# Altium footprint library goldpin_male_pcb.PcbLib: 157 footprints (part 5 of 10)
Each footprint in its own frame and in the unit in brackets; x right, y up, seen from the top. Pads: shape width x height; smd on the part's side, far side on the other; paste and mask are expansions set on the pad; w line width, h text height; cw(c..) or ccw(c..) is an arc to the next point about the centre after c.
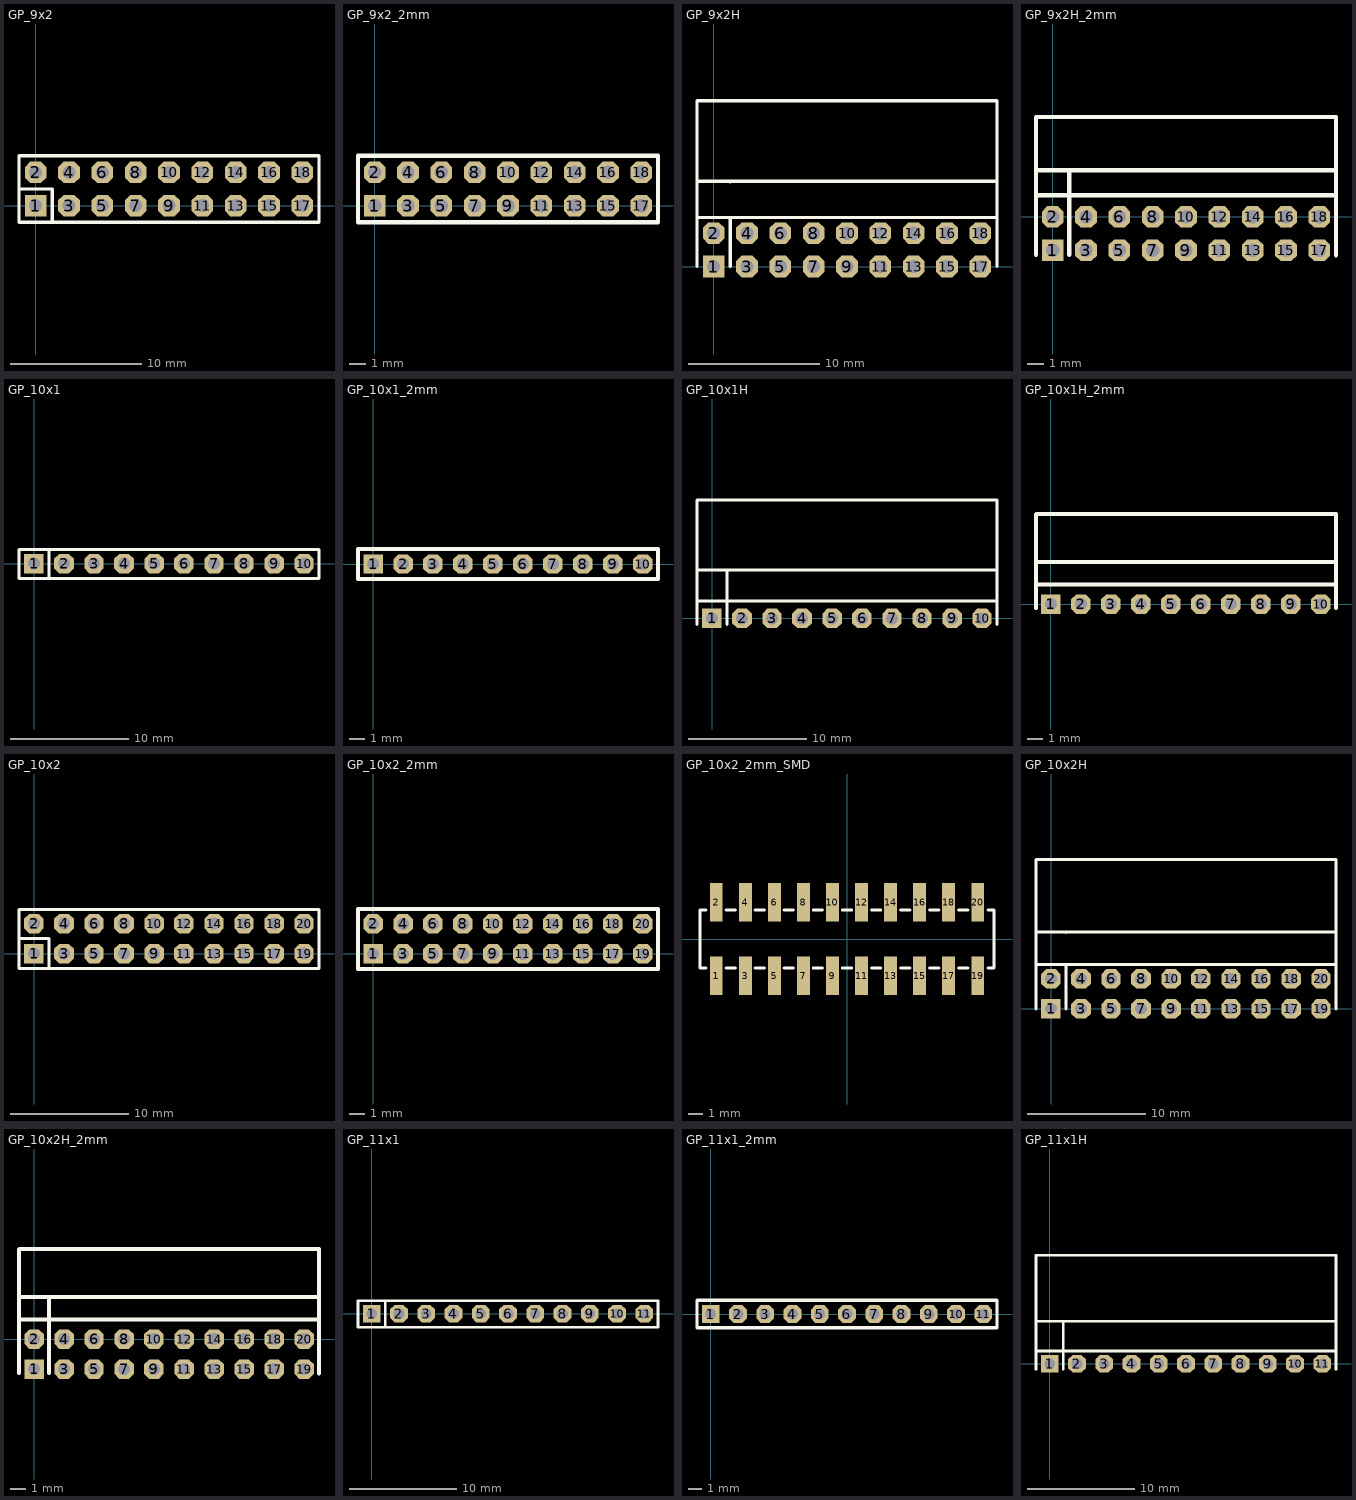
[diagram p4: the footprints below, top view; thin cyan lines are the x and y axes]

## GP_9x2 [mil]
pads (18):
  rect 65x65 hole 39.37: 1(0,0)
  oct 65x65 hole 39.37: 2(0,100) 3(100,0) 4(100,100) 5(200,0) 6(200,100) 7(300,0) 8(300,100) 9(400,0) 10(400,100) 11(500,0) 12(500,100) 13(600,0) 14(600,100) 15(700,0) 16(700,100) 17(800,0) 18(800,100)
Top Overlay:
  lines w10: -50,50 50,50 50,-50 ; -50,-50 850,-50 850,150 -50,150 -50,-50
3D body "Samtec-TSW-109-23-F-D.STEP": height 330, standoff -115, extent -50,-50 850,150

## GP_9x2_2mm [mm]
height 4.45
pads (18):
  rect 1.3x1.3 hole 0.8: 1(0,0)
  oct 1.3x1.3 hole 0.8: 2(0,2) 3(2,0) 4(2,2) 5(4,0) 6(4,2) 7(6,0) 8(6,2) 9(8,0) 10(8,2) 11(10,0) 12(10,2) 13(12,0) 14(12,2) 15(14,0) 16(14,2) 17(16,0) 18(16,2)
Top Overlay:
  lines w0.254: -1,-1 -1,2.999 17,2.999 17,-1 -1,-1
3D body "Samtec-TMM-109-03-G-D.STEP": height 6.51, standoff -1.69, extent -1,-0.968 17,2.969

## GP_9x2H [mil]
pads (18):
  rect 65x65 hole 39.37: 1(0,0)
  oct 65x65 hole 39.37: 2(0,100) 3(100,0) 4(100,100) 5(200,0) 6(200,100) 7(300,0) 8(300,100) 9(400,0) 10(400,100) 11(500,0) 12(500,100) 13(600,0) 14(600,100) 15(700,0) 16(700,100) 17(800,0) 18(800,100)
Top Overlay:
  lines w10: -50,0 -50,180.31 -50,497.64 850,497.64 850,0 ; -50,147.24 850,147.24 ; -50,255.51 850,255.51 ; 49.21,255.51 50,254.72 ; 50,0 50,147.24
3D body "Samtec-TSW-109-08-F-D-RA.STEP": height 220, standoff -90, extent -50,-12.5 850,490

## GP_9x2H_2mm [mm]
height 4.45
pads (18):
  rect 1.3x1.3 hole 0.8: 1(0,-2)
  oct 1.3x1.3 hole 0.8: 2(0,0) 3(2,-2) 4(2,0) 5(4,-2) 6(4,0) 7(6,-2) 8(6,0) 9(8,-2) 10(8,0) 11(10,-2) 12(10,0) 13(12,-2) 14(12,0) 15(14,-2) 16(14,0) 17(16,-2) 18(16,0)
Top Overlay:
  lines w0.254: -1,-2.275 -1,1.822 -1,5.973 ; -1,1.3 17,1.3 ; -1,2.8 17,2.8 ; 0.99,-2.275 0.99,2.775 ; 17,-2.3 17,6
  lines w0.256: -1,5.973 -0.973,6 17,6
3D body "Samtec-TMM-109-03-G-D-RA.STEP": height 3.97, standoff -3.02, extent -1.025,-2.261 16.975,5.961

## GP_10x1 [mil]
pads (10):
  rect 65x65 hole 39.37: 1(0,0)
  oct 65x65 hole 39.37: 2(100,0) 3(200,0) 4(300,0) 5(400,0) 6(500,0) 7(600,0) 8(700,0) 9(800,0) 10(900,0)
Top Overlay:
  lines w10: 50,-50 50,47.24 ; -50,-50 -50,47.24 950,47.24 950,-50 -50,-50
3D body "Samtec-TSW-110-23-F-S.STEP": height 330, standoff -115, extent -50,-50 950,50

## GP_10x1_2mm [mm]
height 4.45
pads (10):
  rect 1.3x1.3 hole 0.8: 1(0,0)
  oct 1.3x1.3 hole 0.8: 2(2,0) 3(4,0) 4(6,0) 5(8,0) 6(10,0) 7(12,0) 8(14,0) 9(16,0) 10(18,0)
Top Overlay:
  lines w0.254: -1,-1 19,-1 19,1 -1,1 -1,-1
3D body "Samtec-TMM-110-03-G-S.STEP": height 5.51, standoff -2.69, extent -1,-0.99 19,0.991

## GP_10x1H [mil]
pads (10):
  rect 65x65 hole 39.37: 1(0,0)
  oct 65x65 hole 39.37: 2(100,0) 3(200,0) 4(300,0) 5(400,0) 6(500,0) 7(600,0) 8(700,0) 9(800,0) 10(900,0)
Top Overlay:
  lines w10: -50,-19.68 -50,80.31 -50,395 950,395 950,-19.68 ; -50,57.24 950,57.24 ; -50,160.51 950,160.51 ; 50,-19.68 50,80.31 50,160.51
3D body "Samtec-TSW-110-08-F-S-RA.STEP": height 120, standoff -90, extent -50,-10 950,392.5

## GP_10x1H_2mm [mm]
height 4.45
pads (10):
  rect 1.3x1.3 hole 0.8: 1(0,0)
  oct 1.3x1.3 hole 0.8: 2(2,0) 3(4,0) 4(6,0) 5(8,0) 6(10,0) 7(12,0) 8(14,0) 9(16,0) 10(18,0)
Top Overlay:
  lines w0.254: -1,-0.25 -1,1.822 -1,5.973 ; -1,1.3 19,1.3 ; -1,2.8 19,2.8
  lines w0.256: -1,5.973 -0.973,6 19,6 19,-0.25
3D body "Samtec-TMM-110-03-G-S-RA.STEP": height 1.99, standoff -3.04, extent -1,-0.25 19,5.973

## GP_10x2 [mil]
pads (20):
  rect 65x65 hole 39.37: 1(0,0)
  oct 65x65 hole 39.37: 2(0,100) 3(100,0) 4(100,100) 5(200,0) 6(200,100) 7(300,0) 8(300,100) 9(400,0) 10(400,100) 11(500,0) 12(500,100) 13(600,0) 14(600,100) 15(700,0) 16(700,100) 17(800,0) 18(800,100) 19(900,0) 20(900,100)
Top Overlay:
  lines w10: -50,50 50,50 50,-50 ; -50,-50 950,-50 950,147.24 -50,147.24 -50,-50
3D body "Samtec-TSW-110-23-F-D.STEP": height 330, standoff -115, extent -50,-50 950,150

## GP_10x2_2mm [mm]
height 4.45
pads (20):
  rect 1.3x1.3 hole 0.8: 1(0,0)
  oct 1.3x1.3 hole 0.8: 2(0,2) 3(2,0) 4(2,2) 5(4,0) 6(4,2) 7(6,0) 8(6,2) 9(8,0) 10(8,2) 11(10,0) 12(10,2) 13(12,0) 14(12,2) 15(14,0) 16(14,2) 17(16,0) 18(16,2) 19(18,0) 20(18,2)
Top Overlay:
  lines w0.254: -1,-1 -1,2.999 19,2.999 19,-1 -1,-1
3D body "Samtec-TMM-110-03-G-D.STEP": height 5.51, standoff -2.69, extent -1,-0.968 19,2.969

## GP_10x2_2mm_SMD [mm]
pads (20):
  rect 0.89x2.65 smd: 1(-9,-2.54) 2(-9,2.54) 3(-7,-2.54) 4(-7,2.54) 5(-5,-2.54) 6(-5,2.54) 7(-3,-2.54) 8(-3,2.54) 9(-1,-2.54) 10(-1,2.54) 11(1,-2.54) 12(1,2.54) 13(3,-2.54) 14(3,2.54) 15(5,-2.54) 16(5,2.54) 17(7,-2.54) 18(7,2.54) 19(9,-2.54) 20(9,2.54)
Top Overlay:
  lines w0.2: -9.7,-2 -10.125,-2 -10.125,2 -9.7,2 ; -8.325,-2 -7.675,-2 ; -8.325,2 -7.675,2 ; -6.325,-2 -5.675,-2 ; -6.325,2 -5.675,2 ; -4.325,-2 -3.675,-2 ; -4.325,2 -3.675,2 ; -2.325,-2 -1.675,-2 ; -2.325,2 -1.675,2 ; -0.325,-2 0.325,-2 ; -0.325,2 0.325,2 ; 1.675,-2 2.325,-2 ; 1.675,2 2.325,2 ; 3.675,-2 4.325,-2 ; 3.675,2 4.325,2 ; 5.675,-2 6.325,-2 ; 5.675,2 6.325,2 ; 7.675,-2 8.325,-2 ; 7.675,2 8.325,2 ; 9.7,-2 10.125,-2 10.125,2 9.7,2
3D body "Samtec-TMM-110-01-G-D-SM.STEP": height 5.9, standoff -0.07, extent -10,-3.27 10,3.334

## GP_10x2H [mil]
pads (20):
  rect 65x65 hole 39.37: 1(0,0)
  oct 65x65 hole 39.37: 2(0,100) 3(100,0) 4(100,100) 5(200,0) 6(200,100) 7(300,0) 8(300,100) 9(400,0) 10(400,100) 11(500,0) 12(500,100) 13(600,0) 14(600,100) 15(700,0) 16(700,100) 17(800,0) 18(800,100) 19(900,0) 20(900,100)
Top Overlay:
  lines w10: -50,0 -50,180.31 -50,497.64 950,497.64 950,0 ; -50,147.24 950,147.24 ; -50,255.51 950,255.51 ; 49.21,255.51 50,254.72 ; 50,0 50,147.24
3D body "Samtec-TSW-110-08-F-D-RA.STEP": height 220, standoff -90, extent -50,-10 950,492.5

## GP_10x2H_2mm [mm]
height 4.45
pads (20):
  rect 1.3x1.3 hole 0.8: 1(0,-2)
  oct 1.3x1.3 hole 0.8: 2(0,0) 3(2,-2) 4(2,0) 5(4,-2) 6(4,0) 7(6,-2) 8(6,0) 9(8,-2) 10(8,0) 11(10,-2) 12(10,0) 13(12,-2) 14(12,0) 15(14,-2) 16(14,0) 17(16,-2) 18(16,0) 19(18,-2) 20(18,0)
Top Overlay:
  lines w0.254: -1,-2.275 -1,1.822 -1,5.973 ; -1,1.3 19,1.3 ; -1,2.8 19,2.8 ; 0.99,-2.275 0.99,2.775 ; 19,-2.3 19,6
  lines w0.256: -1,5.973 -0.973,6 19,6
3D body "Samtec-TMM-110-03-G-D-RA.STEP": height 3.97, standoff -3.02, extent -1.025,-2.261 18.975,5.961

## GP_11x1 [mil]
pads (11):
  rect 65x65 hole 39.37: 1(0,0)
  oct 65x65 hole 39.37: 2(100,0) 3(200,0) 4(300,0) 5(400,0) 6(500,0) 7(600,0) 8(700,0) 9(800,0) 10(900,0) 11(1000,0)
Top Overlay:
  lines w10: 50,-50 50,47.24 ; -50,-50 -50,47.24 1050,47.24 1050,-50 -50,-50
3D body "Samtec-TSW-111-23-F-S.STEP": height 330, standoff -115, extent -50,-50 1050,50

## GP_11x1_2mm [mm]
height 4.45
pads (11):
  rect 1.3x1.3 hole 0.8: 1(0,0)
  oct 1.3x1.3 hole 0.8: 2(2,0) 3(4,0) 4(6,0) 5(8,0) 6(10,0) 7(12,0) 8(14,0) 9(16,0) 10(18,0) 11(20,0)
Top Overlay:
  lines w0.254: -1,-1 21,-1 21,1 -1,1 -1,-1
3D body "Samtec-TMM-111-03-G-S.STEP": height 5.51, standoff -2.69, extent -1,-0.99 21,0.991

## GP_11x1H [mil]
pads (11):
  rect 65x65 hole 39.37: 1(0,0)
  oct 65x65 hole 39.37: 2(100,0) 3(200,0) 4(300,0) 5(400,0) 6(500,0) 7(600,0) 8(700,0) 9(800,0) 10(900,0) 11(1000,0)
Top Overlay:
  lines w10: -50,-19.68 -50,80.31 -50,397.64 1050,397.64 1050,-19.68 ; -50,47.24 1050,47.24 ; -50,155.51 1050,155.51 ; 49.21,155.51 50,154.72 50,80.31 50,-19.68
3D body "Samtec-TSW-111-08-F-S-RA.STEP": height 120, standoff -90, extent -50,-10 1050,392.5